# Altium footprint library FOC.PcbLib: 148 footprints (part 2 of 10)
Each footprint in its own frame and in the unit in brackets; x right, y up, seen from the top. Pads: shape width x height; smd on the part's side, far side on the other; paste and mask are expansions set on the pad; w line width, h text height; cw(c..) or ccw(c..) is an arc to the next point about the centre after c.
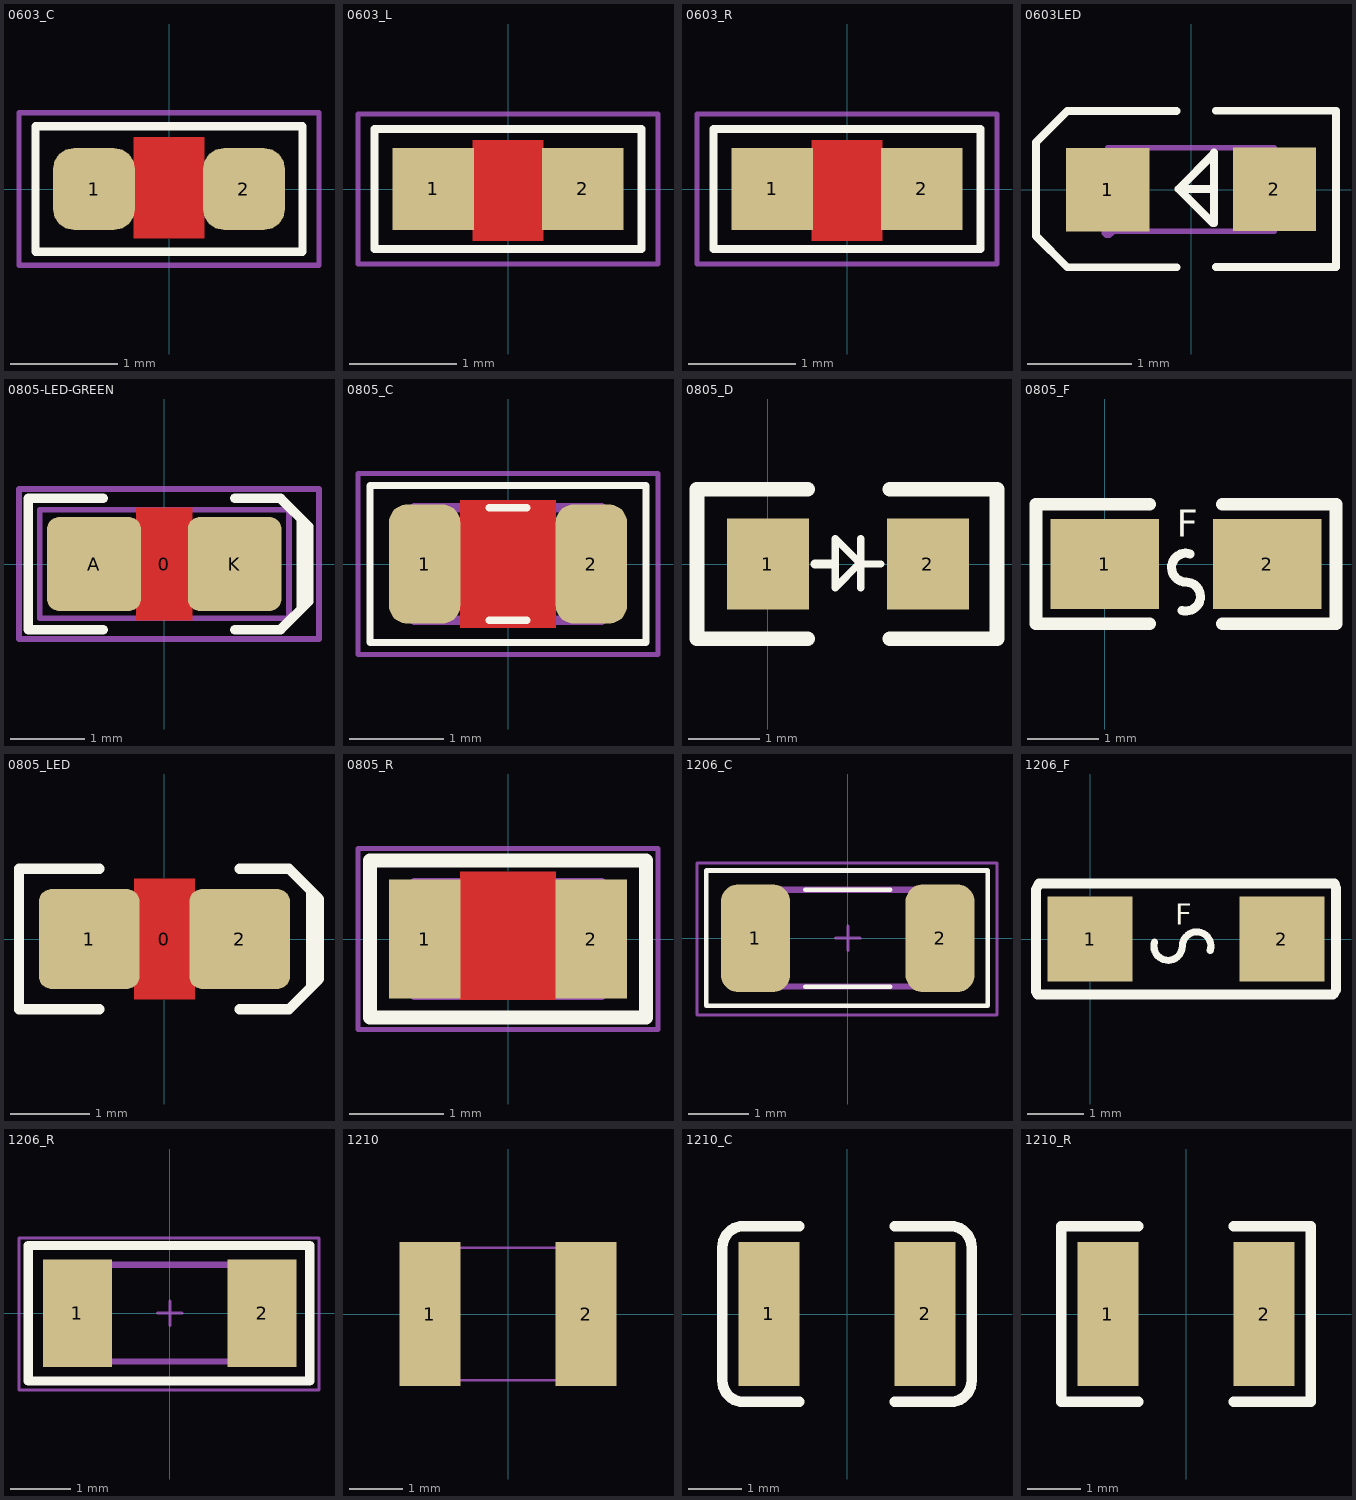
[diagram p1: the footprints below, top view; thin cyan lines are the x and y axes]

## 0603_C [mil] "Capacitor"
height 33.46
pads (2):
  rrect50% 30x30 smd: 1(-27.5,0) 2(27.5,0)
Top Layer:
  pour cut-out: -13,19 13,19 13,-18 -13,-18
Top Overlay:
  lines w3: -49,-23 49,-23 49,23 -49,23 -49,-23
Mechanical 15:
  lines w1.97: -7.87,0 7.87,0 ; 0,-7.87 0,7.87 ; -55,-28 55,-28 55,28 -55,28 -55,-28
3D body: height 33.46, standoff 0, extent -23.05,-15 23.05,15
3D body: height 33.46, standoff 0, extent 23.1,-15 34.91,15
3D body: height 33.46, standoff 0, extent -34.9,-15 -23.09,15

## 0603_L [mil]
height 23.62
pads (2):
  rect 30x30 smd: 1(-27.5,0) 2(27.5,0)
Top Layer:
  pour cut-out: -13,18 13,18 13,-19 -13,-19
Top Overlay:
  lines w3: -49,-22 -49,22 49,22 49,-22 -49,-22
Mechanical 15:
  lines w1.97: -7.87,0 0,0 ; 0,-7.87 0,0 ; 0,7.87 0,0 ; 7.87,0 0,0 ; -55.12,-27.56 55.12,-27.56 55.12,27.56 -55.12,27.56 -55.12,-27.56
3D body: height 23.62, standoff 0, extent -23.04,-15 23.05,15
3D body: height 23.62, standoff 0, extent -34.9,-15 -23.09,15
3D body: height 23.62, standoff 0, extent 23.1,-15 34.91,15

## 0603_R [mil] "Resistor"
height 23.62
pads (2):
  rect 30x30 smd: 1(-27.5,0) 2(27.5,0)
Top Layer:
  pour cut-out: -13,18 13,18 13,-19 -13,-19
Top Overlay:
  lines w3: -49,-22 49,-22 49,22 -49,22 -49,-22
Mechanical 15:
  lines w1.97: -7.87,0 0,0 ; 0,-7.87 0,0 ; 0,7.87 0,0 ; 7.87,0 0,0 ; -55.12,-27.56 -55.12,27.56 55.12,27.56 55.12,-27.56 -55.12,-27.56
3D body: height 23.62, standoff 0, extent 23.1,-15 34.91,15
3D body: height 23.62, standoff 0, extent -34.9,-15 -23.09,15
3D body: height 23.62, standoff 0, extent -23.04,-15 23.05,15

## 0603LED [mm]
pads (2):
  rect 0.8x0.8 smd: 1(-0.8,-0.003) 2(0.8,0.003)
Top Overlay:
  lines w0.076: -0.14,-0.746 -1.19,-0.746 -1.49,-0.446 -1.49,-0.346 -1.49,0.354 -1.49,0.454 -1.19,0.754 -0.14,0.754 ; 0.22,0.007 -0.12,0.007 ; 0.24,-0.744 1.39,-0.744 ; 0.24,0.757 1.39,0.757 1.39,-0.723 ; -0.12,0.007 0.21,-0.323 0.22,-0.323 0.22,0.357 0.22,0.347 -0.12,0.007
Mechanical 6:
  region: 0.529,0.068 1.069,0.068 1.069,-0.062 0.529,-0.062
  region: 0.735,-0.267 0.735,0.273 0.865,0.273 0.865,-0.267
  region: -1.07,0.062 -0.53,0.062 -0.53,-0.068 -1.07,-0.068
Mechanical 15:
  region: -0.74,-0.403 -0.741,-0.379 -0.775,-0.346 -0.824,-0.346 -0.858,-0.379 -0.859,-0.403 -0.858,-0.428 -0.824,-0.461 -0.775,-0.461 -0.741,-0.428
  region: 0.5,-0.396 0.5,0.404 0.8,0.404 0.8,-0.396
  region: -0.8,-0.403 -0.8,0.397 -0.5,0.397 -0.5,-0.403
  lines w0.051: -0.8,-0.4 -0.8,0.4 0.8,0.4 0.8,-0.4 -0.8,-0.4
3D body "0603LED.STEP": height 0.6, standoff -0.01, extent -0.794,-0.402 0.826,0.398

## 0805-LED-GREEN [mil]
height 31.5
pads (3):
  round 20 on Mech14: 0(0,0)
  rrect25% 50x50 smd: A(-37.5,0) K(37.5,0)
Top Layer:
  pour cut-out: -15,30 15,30 15,-30 -15,-30
Top Overlay:
  lines w5: -32.5,-35 -72.5,-35 -72.5,35 -32.5,35 ; 37.5,-35 62,-35 77,-20 77,20 62,35 37.5,35 ; 73,-24 73,24
Mechanical 13:
  lines w3: -66.5,-29 66.5,-29 66.5,29 -66.5,29 -66.5,-29
Mechanical 14:
  lines w3: -77.5,-40 82.5,-40 82.5,40 -77.5,40 -77.5,-40
3D body: height 31.5, standoff 11.81, extent -26.49,-24.61 28.65,24.6
3D body: height 11.81, standoff 3.94, extent -39.37,-24.61 39.37,24.61
3D body: height 3.94, standoff 0, extent -39.37,-24.61 39.37,24.61
3D body: height 3.94, standoff 0, extent -11.81,-15.75 11.81,15.75

## 0805_C [mil] "Capacitor"
height 21.65
pads (2):
  rrect50% 30x50 smd: 1(-35,0) 2(35,0)
Top Layer:
  pour cut-out: -20,26.81 20,26.81 20,-26.81 -20,-26.81
Top Overlay:
  lines w3: -7.87,-23.62 7.87,-23.62 ; -7.87,23.62 7.87,23.62 ; -58,-33 58,-33 58,33 -58,33 -58,-33
Mechanical 13:
  lines w3.94: -31.5,-23.62 -31.5,23.62 ; 31.5,-23.62 31.5,23.62 ; -39.37,-23.62 -39.37,23.62 39.37,23.62 39.37,-23.62 -39.37,-23.62
Mechanical 15:
  lines w1.97: -7.87,0 0,0 ; 0,-7.87 0,7.87 ; 7.87,0 0,0 ; 0,0 0,0 ; -63,-38 -63,38 63,38 63,-38 -63,-38
3D body: height 21.65, standoff 0, extent -39.35,-23.6 -31.52,23.6
3D body: height 21.65, standoff 0, extent 31.52,-23.6 39.35,23.6
3D body: height 21.65, standoff 0, extent -31.5,-23.62 31.52,23.62

## 0805_D [mil]
pads (2):
  rect 45x50 smd: 1(0,0) 2(88,0)
Top Overlay:
  lines w4: 51,-13 51,14 ; 62,0 51,0 ; 51,0 50,0 37,-13 37,14 51,0
  lines w5: 26,0 36,0
  lines w8: 22,-41 -39,-41 -39,41 22,41 ; 67,-41 126,-41 126,41 67,41

## 0805_F [mil]
pads (2):
  rect 60x50 smd: 1(0,0) 2(90,0)
Top Overlay:
  lines w5: 42.66,-25.65 ccw(c45,-18) 45,-10 cw(c45,-2) 47.34,5.65
  lines w7: 25,-33 -38,-33 -38,33 25,33 ; 65,-33 128,-33 128,33 65,33
  text "F" at 40,15 h15
3D body: height 29.5, standoff -29.5, extent 1.5,-25 88.5,24

## 0805_LED [mil]
pads (3):
  round 20 on Mech14: 0(0,0)
  rrect25% 50x50 smd: 1(-37.5,0) 2(37.5,0)
Top Layer:
  pour cut-out: -15,30 15,30 15,-30 -15,-30
Top Overlay:
  lines w5: -32.5,-35 -72.5,-35 -72.5,35 -32.5,35 ; 37.5,-35 62,-35 77,-20 77,20 62,35 37.5,35 ; 73,-24 73,24
3D body: height 31.5, standoff 11.81, extent -26.49,-24.61 28.65,24.6
3D body: height 11.81, standoff 3.94, extent -39.37,-24.61 39.37,24.61
3D body: height 3.94, standoff 0, extent -39.37,-24.61 39.37,24.61
3D body: height 3.94, standoff 0, extent -11.81,-15.75 11.81,15.75

## 0805_R [mil] "Resistor"
height 21.65
pads (2):
  rect 30x50 smd: 1(-35,0) 2(35,0)
Top Layer:
  pour cut-out: -20,28.19 20,28.19 20,-25.43 -20,-25.43
Top Overlay:
  lines w6: -58,-33 58,-33 58,33 -58,33 -58,-33
Mechanical 13:
  lines w3.94: -31.5,-23.62 -31.5,23.62 ; 31.5,-23.62 31.5,23.62 ; -39.37,-23.62 -39.37,23.62 39.37,23.62 39.37,-23.62 -39.37,-23.62
Mechanical 15:
  lines w1.97: -7.87,0 0,0 ; 0,-7.87 0,7.87 ; 7.87,0 0,0 ; 0,0 0,0 ; -63,-38 -63,38 63,38 63,-38 -63,-38
3D body: height 21.65, standoff 0, extent -39.35,-23.6 -31.52,23.6
3D body: height 21.65, standoff 0, extent 31.52,-23.6 39.35,23.6
3D body: height 21.65, standoff 0, extent -31.5,-23.62 31.52,23.62

## 1206_C [mil] "Capacitor"
height 47.24
pads (2):
  rrect50% 45x70 smd: 1(-60,0) 2(60,0)
Top Overlay:
  lines w3: -27.56,-31.5 27.56,-31.5 ; -27.56,31.5 27.56,31.5 ; -92,-44 -92,44 91,44 91,-44 -92,-44
Mechanical 13:
  lines w3.94: -51.18,-31.5 -51.18,31.5 ; 51.18,-31.5 51.18,31.5 ; -62.99,-31.5 62.99,-31.5 62.99,31.5 -62.99,31.5 -62.99,-31.5
Mechanical 15:
  lines w1.97: -7.87,0 -0.01,0 ; 0,-7.87 0,7.87 ; 0,0 7.87,0 ; -0.01,0 0,0 ; 7.87,0 7.87,0 ; -98,-50 97,-50 97,49 -98,49 -98,-50
3D body: height 47.24, standoff 0, extent -62.97,-31.48 -51.2,31.48
3D body: height 47.24, standoff 0, extent 51.2,-31.48 62.97,31.48
3D body: height 47.24, standoff 0, extent -51.16,-31.48 51.16,31.48

## 1206_F [mil]
pads (2):
  rect 60x60 smd: 1(0,0) 2(135,0)
Top Overlay:
  lines w5: 45.35,-2.08 ccw(c54.91,-5) 64.91,-5 ; 65,-5 cw(c75,-5) 84.56,-7.92
  lines w7: -38,-37 -37,-39 171,-39 173,-36 173,36 172,39 -36,39 -38,35 -38,-37
  text "F" at 60,10 h15
3D body "User Library-Litttlefuse 1206.step": height 58.58, standoff 1.42, extent 1.98,-32.51 128.04,32.52

## 1206_R [mil] "Resistor"
height 47.24
pads (2):
  rect 45x70 smd: 1(-60,0) 2(60,0)
Top Overlay:
  lines w6: -92,-44 -92,44 91,44 91,-44 -92,-44
Mechanical 13:
  lines w3.94: -51.18,-31.5 -51.18,31.5 ; 51.18,-31.5 51.18,31.5 ; -62.99,-31.5 62.99,-31.5 62.99,31.5 -62.99,31.5 -62.99,-31.5
Mechanical 15:
  lines w1.97: -7.87,0 -0.01,0 ; 0,-7.87 0,7.87 ; 0,0 7.87,0 ; -0.01,0 0,0 ; 7.87,0 7.87,0 ; -98,-50 97,-50 97,49 -98,49 -98,-50
3D body: height 47.24, standoff 0, extent -62.97,-31.48 -51.2,31.48
3D body: height 47.24, standoff 0, extent 51.2,-31.48 62.97,31.48
3D body: height 47.24, standoff 0, extent -51.16,-31.48 51.16,31.48

## 1210 [mm]
pads (2):
  rect 1.16x2.72 smd: 1(-1.475,0) 2(1.475,0)
Mechanical 13:
  lines w0.05: -1.6,-1.25 -1.6,1.25 1.6,1.25 1.6,-1.25 -1.6,-1.25

## 1210_C [mm]
pads (2):
  rect 1.16x2.72 smd: 1(-1.475,0) 2(1.475,0)
Top Overlay:
  lines w0.2: -0.9,-1.66 -1.955,-1.66 cw(c-1.955,-1.26) -2.355,-1.26 -2.355,1.26 cw(c-1.955,1.26) -1.955,1.66 -0.9,1.66 ; 0.9,-1.66 1.955,-1.66 ccw(c1.955,-1.26) 2.355,-1.26 2.355,1.26 ccw(c1.955,1.26) 1.955,1.66 0.9,1.66
3D body "User Library-cap_1210_lowprofile.step": height 1.3, standoff 0, extent -1.6,-1.25 1.6,1.25

## 1210_R [mm]
pads (2):
  rect 1.16x2.72 smd: 1(-1.475,0) 2(1.475,0)
Top Overlay:
  lines w0.2: -0.9,-1.66 -2.355,-1.66 -2.355,1.66 -0.9,1.66 ; 0.9,-1.66 2.355,-1.66 2.355,1.66 0.9,1.66
3D body "User Library-R_1210.STEP": height 0.6, standoff 0, extent -1.6,-1.25 1.6,1.25